# Altium integrated library Resistor.IntLib: 1 symbol
Pins are listed as number, name and electrical type; pins without a type are passive.

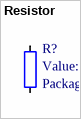
[diagram p0: symbol Resistor]

## Resistor
designator R?
Component Category: Resistor; Manufacturer: *; Manufacturer Part Number: *; Supplier: *; Supplier Part Number: *; Operating Temperature, Min: *℃; Operating Temperature, Max: *℃; Quantity, Min: *; Quantity, Max: *; Price, Min: *; Price, Max: *; Supplier Currency: *; Supplier Link: *; Tolerance: *; Component Type: Fixed Value; ComponentLink1Description: Datasheet; ComponentLink1URL: *; ComponentLink2Description: Supplier Link; ComponentLink2URL: *; Package: *; Value: *
footprint Resistor_SMD_M603_I0201 (Resistor, SMD, M603, I0201)
footprint Resistor_SMD_M1005_I0402 (Resistor, SMD, M1005, I0402)
footprint Resistor_SMD_M1608_I0603 (Resistor, SMD, M1608, I0603)
footprint Resistor_SMD_M2012_I0805 (Resistor, SMD, M2012, I0805)
footprint Resistor_SMD_M3216_I1206 (Resistor, SMD, M3216, I1206)
footprint Resistor_SMD_M5025_I2010 (Resistor, SMD, M5025, I2010)
footprint Resistor_SMD_M6332_I2512 (Resistor, SMD, M1332, I2512)
footprint Resistor_SMD_M3246_I1812 (Resistor, SMD, M3246, I1812)
footprint Resistor_SMD_M3225_I1210 (Resistor, SMD, M3225, I1210)
pins: 1, 2
1 alternate drawing of the same symbol